# Altium footprint library ParsaLibrary.PcbLib: 526 footprints (part 32 of 33)
Each footprint in its own frame and in the unit in brackets; x right, y up, seen from the top. Pads: shape width x height; smd on the part's side, far side on the other; paste and mask are expansions set on the pad; w line width, h text height; cw(c..) or ccw(c..) is an arc to the next point about the centre after c.
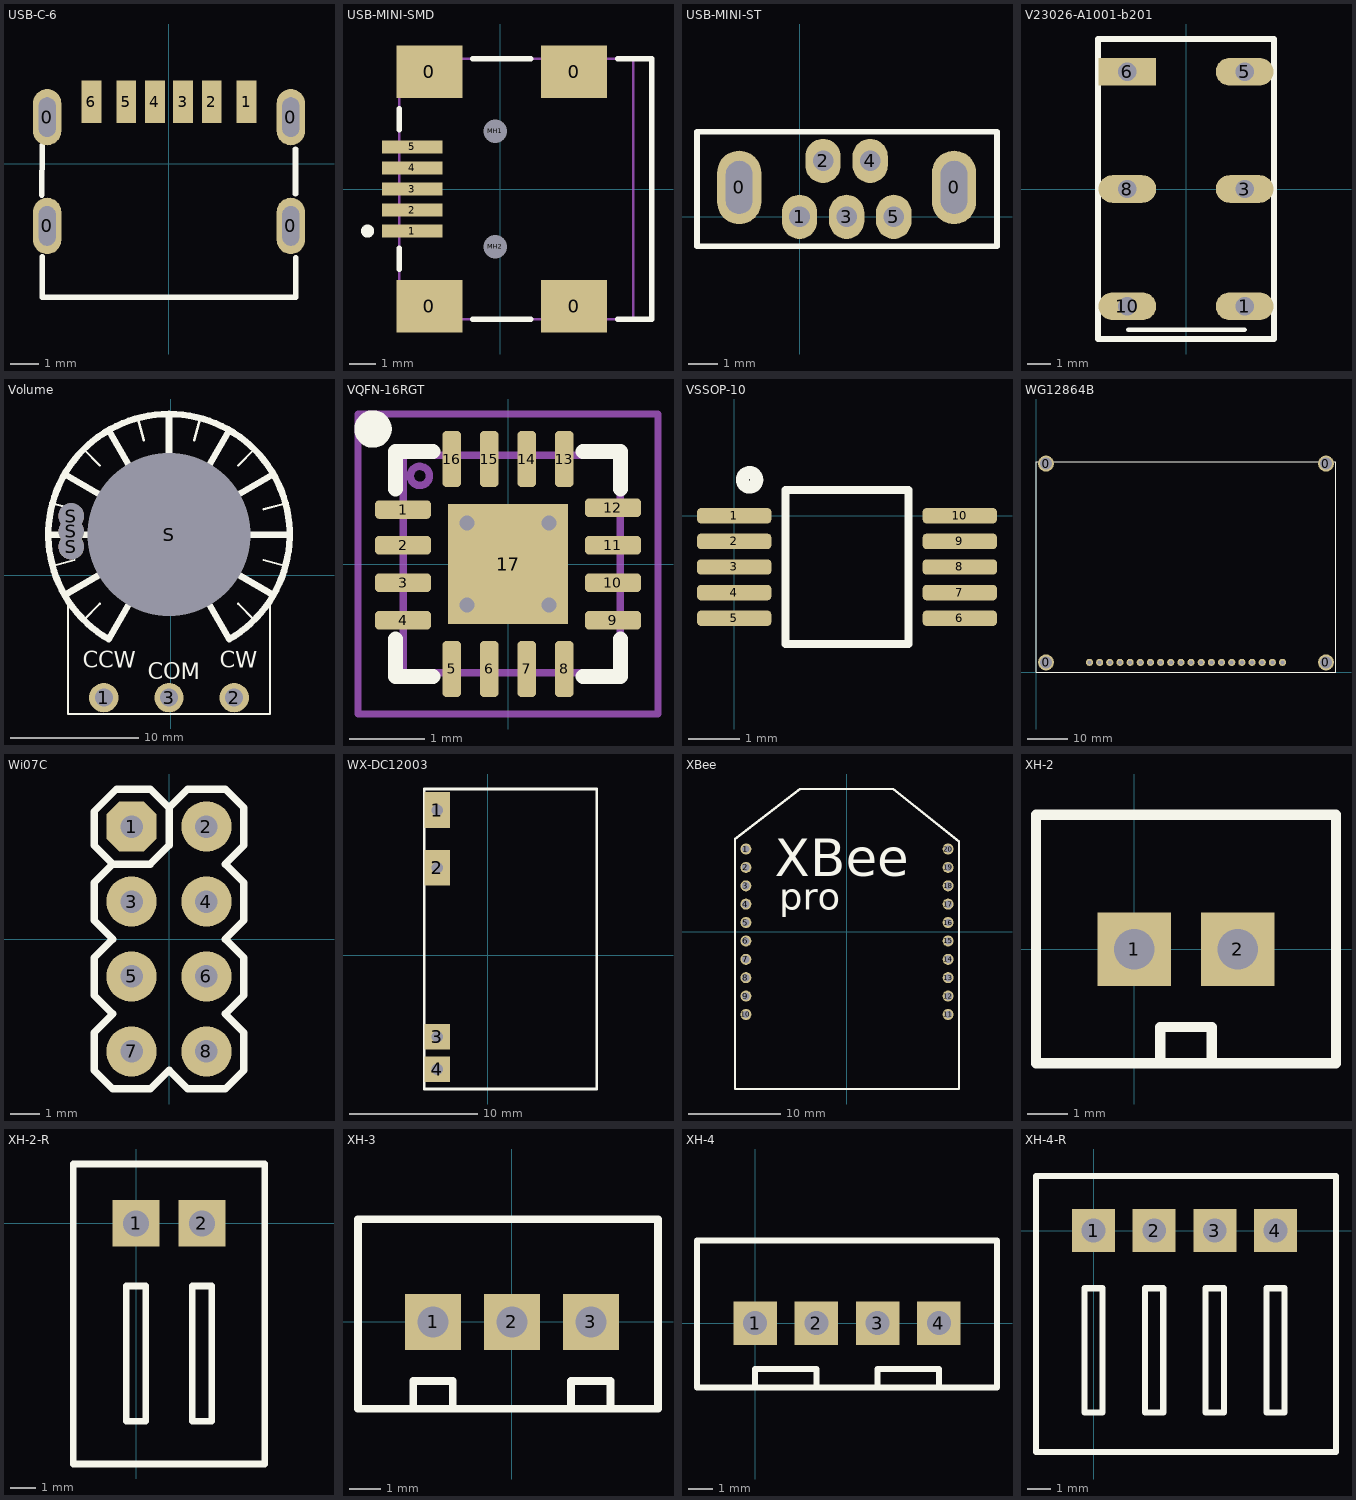
[diagram p31: the footprints below, top view; thin cyan lines are the x and y axes]

## USB-C-6 [mm]
pads (10):
  oval 1x2 hole 0.6 slot 1.4 at 90 deg: 0(-4.32,-2.2) 0(-4.32,1.66) 0(4.32,-2.2) 0(4.32,1.66)
  rect 0.7x1.5 smd: 1(2.75,2.2) 2(1.52,2.2) 3(0.5,2.2) 4(-0.5,2.2) 5(-1.52,2.2) 6(-2.75,2.2)
Top Overlay:
  lines w0.2: -4.519,-1.101 -4.5,0.664 ; -4.5,-3.299 -4.5,-4.73 4.5,-4.73 4.5,-3.323 ; 4.488,-1.058 4.488,0.52
3D body "User Library-USB_Type_C_6pin.step": height 3.26, standoff -0.96, extent -4.482,-4.786 4.458,2.014

## USB-MINI-SMD [mm]
pads (11):
  rect 2.5x2 smd: 0(-2.7,-4.45) 0(-2.7,4.45) 0(2.8,-4.45) 0(2.8,4.45)
  rect 2.3x0.5 smd: 1(-3.35,-1.6) 2(-3.35,-0.8) 3(-3.35,0) 4(-3.35,0.8) 5(-3.35,1.6)
  round 0.6 hole 0.9 unplated: MH1(-0.2,2.2) MH2(-0.2,-2.2)
Top Overlay:
  circle w0.25: c-5.05,-1.6 r0.125
  lines w0.2: -3.85,-3.05 -3.85,-2.25 ; -3.85,2.25 -3.85,3.05 ; -1.05,-4.95 1.15,-4.95 ; -1.05,4.95 1.15,4.95 ; 4.45,-4.95 5.75,-4.95 5.75,4.95 4.45,4.95
Mechanical 1:
  lines w0.1: 5.05,-4.95 5.05,4.95
  text "PCB Edge" at 5.482,-4.036 h0.25
Mechanical 13:
  lines w0.1: -3.85,-4.95 -3.85,4.95 5.75,4.95 5.75,-4.95 -3.85,-4.95
3D body "usb_a-usb_b-m5-smd-c.STEP": height 3.93, standoff -1, extent -3.5,-5.05 5.75,4.85

## USB-MINI-ST [mm]
pads (7):
  oval 1.5x2.5 hole 1.8 slot 0.9 at 0 deg: 0(-2.05,1) 0(5.25,1)
  oval 1.2x1.5 hole 0.7: 1(0,0) 2(0.8,1.9) 3(1.6,0) 4(2.4,1.9) 5(3.2,0)
Top Overlay:
  circle w0.25: c-0.036,-0.353 r0.125
  lines w0.2: 6.697,2.889 -3.483,2.889 -3.483,-0.998 6.708,-0.998 6.708,2.889
Mechanical 13:
  lines w0.1: -3.483,-0.998 6.417,-0.998
3D body "usb_a-usb_b-m5-top.stp": height 9.5, standoff -2.65, extent -3.5,-1.008 6.7,2.893

## V23026-A1001-b201 [mm]
pads (6):
  oval 2.5x1.2 hole 0.8: 1(2.54,-5.08) 3(2.54,0) 5(2.54,5.08) 8(-2.54,0) 10(-2.54,-5.08)
  rect 2.5x1.2 hole 0.8: 6(-2.54,5.08)
Top Overlay:
  lines w0.2: -2.5,-6.1 2.533,-6.093
  lines w0.254: -3.81,-6.5 3.81,-6.5 3.81,6.5 -3.81,6.5 -3.81,-6.5
3D body: height 6.9, standoff 0, extent -3.81,-6.5 3.81,6.5
3D body: height -1, standoff -3, extent 2.33,-5.35 2.83,-4.85
3D body: height -1, standoff -3, extent 2.33,-0.27 2.83,0.23
3D body: height -1, standoff -3, extent 2.29,4.83 2.79,5.33
3D body: height -1, standoff -3, extent -2.75,4.81 -2.25,5.31
3D body: height -1, standoff -3, extent -2.75,-0.27 -2.25,0.23
3D body: height -1, standoff -3, extent -2.75,-5.35 -2.25,-4.85

## Volume [mil]
pads (7):
  round 90 hole 55: 1(-205,-375) 2(195,-375) 3(-5,-375)
  round 78.74 hole 78.74: S(-305,88) S(-305,135) S(-305,182)
  round 492.13 hole 500: S(-5,125)
Top Overlay:
  lines w7: -362.39,29.24 -294.78,47.35 ; -362.39,220.76 -294.78,202.65 ; -315,-75 -315,-425 305,-425 305,-75 ; -266.63,-136.63 -217.13,-87.13 ; -266.63,386.63 -217.13,337.13 ; -100.76,482.39 -82.65,414.78 ; 72.65,414.78 90.76,482.39 ; 207.13,-87.13 256.63,-136.63 ; 207.13,337.13 256.63,386.63 ; 284.78,47.35 352.39,29.24 ; 284.78,202.65 352.39,220.76
  lines w20: -375,125 -255,125 ; -325.43,-60 -221.51,0 ; -325.43,310 -221.51,250 ; -190,445.43 -130,341.51 ; -130,-91.51 -190,-195.43 cw(c-5,125) 180,-195.43 120,-91.51 ; -5,375 -5,495 ; 120,341.51 180,445.43 ; 211.51,0 315.43,-60 ; 211.51,250 315.43,310 ; 245,125 365,125
  text "COM" at -70,-318 h50
  text "CW" at 150,-283 h50
  text "CCW" at -269,-283 h50
3D body "POT.STEP": height 268.74, standoff -737.48, extent -315,-536 305,433.35
3D body "volome cover2.STEP": height 846.46, standoff 59.06, extent -277.62,-200.03 319.63,473.63

## VQFN-16RGT [mm]
pads (17):
  rrect50% 0.75x0.25 smd: 1(-1.4,0.725) 2(-1.4,0.25) 3(-1.4,-0.25) 4(-1.4,-0.75) 9(1.4,-0.75) 10(1.4,-0.25) 11(1.4,0.25) 12(1.4,0.75)
  rrect50% 0.25x0.75 smd: 5(-0.75,-1.4) 6(-0.25,-1.4) 7(0.25,-1.4) 8(0.75,-1.4) 13(0.75,1.4) 14(0.25,1.4) 15(-0.25,1.4) 16(-0.75,1.4)
  rect 1.6x1.6 smd: 17(0,0)
via -0.55,0.55 diameter 0.5 hole 0.2
via 0.55,0.55 diameter 0.5 hole 0.2
via -0.55,-0.55 diameter 0.5 hole 0.2
via 0.55,-0.55 diameter 0.5 hole 0.2
Top Overlay:
  circle w0.25: c-1.8,1.8 r0.125
  lines w0.2: -1.5,-1 -1.5,-1.5 -1,-1.5 ; -1.5,1 -1.5,1.5 -1,1.5 ; 1,-1.5 1.5,-1.5 1.5,-1 ; 1,1.5 1.5,1.5 1.5,1
Mechanical 13:
  circle w0.1: c-1.175,1.175 r0.127
  lines w0.1: -1.4,-1.45 -1.4,1.45 1.5,1.45 1.5,-1.45 -1.4,-1.45
Mechanical 15:
  lines w0.1: -0.5,0 0.5,0 ; 0,-0.5 0,0.5 ; -2,-2 -2,2 2,2 2,-2 -2,-2
3D body "User Library-QFN-16_3x3.STEP": height 0.9, standoff 0, extent -1.549,-1.521 1.493,1.521

## VSSOP-10 [mm]
pads (10):
  rrect50% 1.45x0.3 smd: 1(0,0) 2(0,-0.5) 3(0,-1) 4(0,-1.5) 5(0,-2) 6(4.4,-2) 7(4.4,-1.5) 8(4.4,-1) 9(4.4,-0.5) 10(4.4,0)
Top Overlay:
  circle w0.254: c0.3,0.7 r0.141
  lines w0.15: 1,-2.5 1,0.5 3.4,0.5 3.4,-2.5 1,-2.5
3D body "User Library-DGS0010A.STEP": height 1.1, standoff 0, extent -0.262,-2.5 4.663,0.5

## WG12864B [mm]
pads (24):
  round 4 hole 3: 0(2.5,52.2) 0(2.5,2.5) 0(72.5,52.2) 0(72.5,2.5)
  round 1.8 hole 1: 1(13.37,2.5) 2(15.91,2.5) 3(18.45,2.5) 4(20.99,2.5) 5(23.53,2.5) 6(26.07,2.5) 7(28.61,2.5) 8(31.15,2.5) 9(33.69,2.5) 10(36.23,2.5) 11(38.77,2.5) 12(41.31,2.5) 13(43.85,2.5) 14(46.39,2.5) 15(48.93,2.5) 16(51.47,2.5) 17(54.01,2.5) 18(56.55,2.5) 19(59.09,2.5) 20(61.63,2.5)
Top Overlay:
  lines w0.254: 0,0 0,52.7 75,52.7 75,0 0,0
3D body "wg12864.STEP": height 14.67, standoff 6.27, extent -0.1,-0.1 74.9,52.6

## Wi07C [mm] "ESP8266 MODULE"
pads (8):
  oct 1.7x1.7 hole 0.762: 1(-1.27,3.81)
  round 1.7 hole 0.762: 2(1.27,3.81) 3(-1.27,1.27) 4(1.27,1.27) 5(-1.27,-1.27) 6(1.27,-1.27) 7(-1.27,-3.81) 8(1.27,-3.81)
Top Overlay:
  lines w0.254: -1.905,2.54 -2.54,3.175 -2.54,4.318 -1.778,5.08 -0.635,5.08 0,4.445 ; -1.905,2.54 -2.54,1.905 -2.54,1.27 -2.54,0.635 -1.905,0 -2.54,-0.635 -2.54,-1.27 -2.54,-1.905 -1.905,-2.54 -2.54,-3.175 -2.54,-3.81 -2.54,-4.445 -1.905,-5.08 -0.635,-5.08 0,-4.445 0.635,-5.08 1.905,-5.08 2.54,-4.445 2.54,-3.175 1.905,-2.54 2.54,-1.905 2.54,-0.635 1.905,0 2.54,0.635 2.54,1.905 1.905,2.54 2.54,3.175 2.54,4.445 1.905,5.08 0.635,5.08 0,4.445 ; -1.905,2.54 -0.635,2.54 0,3.175 0,4.445
3D body "User Library-Wi07C.step": height 10.88, standoff -0.8, extent -2.794,-7.25 22.006,7.25

## WX-DC12003 [mm]
pads (4):
  rect 2x2.8 hole 0.9: 1(-3.948,11.339) 2(-3.948,6.839)
  rect 2x2 hole 0.9: 3(-3.948,-6.361) 4(-3.948,-8.911)
Top Overlay:
  lines w0.2: -4.973,-10.461 8.507,-10.461 8.507,12.989 -4.973,12.989 -4.973,-10.461
3D body "User Library-WX DC.step": height 18.55, standoff 0.4, extent -4.973,-10.486 8.517,13.014

## XBee [mm]
pads (20):
  round 1.2 hole 0.8: 1(-11,9) 2(-11,7) 3(-11,5) 4(-11,3) 5(-11,1) 6(-11,-1) 7(-11,-3) 8(-11,-5) 9(-11,-7) 10(-11,-9) 11(11,-9) 12(11,-7) 13(11,-5) 14(11,-3) 15(11,-1) 16(11,1) 17(11,3) 18(11,5) 19(11,7) 20(11,9)
Top Overlay:
  lines w0.254: -12.19,-17.11 12.19,-17.11 12.19,9.3 12.19,9.813 5.05,15.53 -5.115,15.53 -12.19,10.109 -12.19,9.3 -12.19,-17.11
  text "XBee" at -7.874,4.699 h7
  text "pro" at -7.366,1.397 h5
3D body "User Library-XBP24BZ7SIT-004-radio.step": height 8.96, standoff -0.92, extent -12.192,-16.129 12.192,31.242

## XH-2 [mm]
pads (2):
  rect 1.8x1.8 hole 1: 1(0,0) 2(2.54,0)
Top Overlay:
  lines w0.254: 0.635,-2.794 0.635,-1.905 1.905,-1.905 1.905,-2.794 ; -2.413,-2.794 4.953,-2.794 4.953,3.302 -2.413,3.302 -2.413,-2.794
3D body "User Library-XH-A-1 (2).step": height 7, standoff -3.4, extent -2.43,-2.798 4.97,3.302

## XH-2-R [mm]
pads (2):
  rect 1.8x1.8 hole 1: 1(0,0) 2(2.54,0)
Top Overlay:
  lines w0.254: -2.413,-9.271 4.953,-9.271 4.953,2.286 -2.413,2.286 -2.413,-9.271 ; -0.381,-7.62 0.381,-7.62 0.381,-2.413 -0.381,-2.413 -0.381,-7.62 ; 2.159,-7.62 2.159,-2.413 2.921,-2.413 2.921,-7.62 2.159,-7.62
3D body "User Library-S XH-A2.step": height 6.1, standoff -2, extent -2.43,-9.271 4.97,2.229

## XH-3 [mm]
pads (3):
  rect 1.8x1.8 hole 1: 1(-2.54,0) 2(0,0) 3(2.54,0)
Top Overlay:
  lines w0.254: -3.175,-2.794 -3.175,-1.905 -1.905,-1.905 -1.905,-2.794 ; 1.905,-2.794 1.905,-1.905 3.175,-1.905 3.175,-2.794 ; -4.953,-2.794 -4.953,3.302 4.699,3.302 4.699,-2.794 -4.953,-2.794
3D body "User Library-XH-A-1.step": height 7, standoff -3.4, extent -4.95,-2.794 4.95,3.306

## XH-4 [mm]
pads (4):
  rect 1.8x1.8 hole 1: 1(0,0) 2(2.54,0) 3(5.08,0) 4(7.62,0)
Top Overlay:
  lines w0.254: 0,-2.667 0,-1.905 2.54,-1.905 2.54,-2.667 ; 5.08,-2.667 5.08,-1.905 7.62,-1.905 7.62,-2.667 ; -2.413,-2.667 -2.413,3.429 10.033,3.429 10.033,-2.667 -2.413,-2.667
3D body "User Library-XH-A-1 (4).step": height 7, standoff -3.4, extent -2.39,-2.667 10.01,3.433

## XH-4-R [mm]
pads (4):
  rect 1.8x1.8 hole 1: 1(0,0) 2(2.54,0) 3(5.08,0) 4(7.62,0)
Top Overlay:
  lines w0.254: -2.413,-9.271 10.16,-9.271 10.16,2.286 -2.413,2.286 -2.413,-9.271 ; -0.381,-7.62 0.381,-7.62 0.381,-2.413 -0.381,-2.413 -0.381,-7.62 ; 2.159,-7.62 2.159,-2.413 2.921,-2.413 2.921,-7.62 2.159,-7.62 ; 4.699,-7.62 4.699,-2.413 5.461,-2.413 5.461,-7.62 4.699,-7.62 ; 7.239,-7.62 7.239,-2.413 8.001,-2.413 8.001,-7.62 7.239,-7.62
3D body "User Library-S XH-A4.step": height 6.1, standoff -2, extent -2.413,-9.144 9.987,2.356